# Altium footprint library WallLight.PcbLib: 33 footprints (part 1 of 3)
Each footprint in its own frame and in the unit in brackets; x right, y up, seen from the top. Pads: shape width x height; smd on the part's side, far side on the other; paste and mask are expansions set on the pad; w line width, h text height; cw(c..) or ccw(c..) is an arc to the next point about the centre after c.
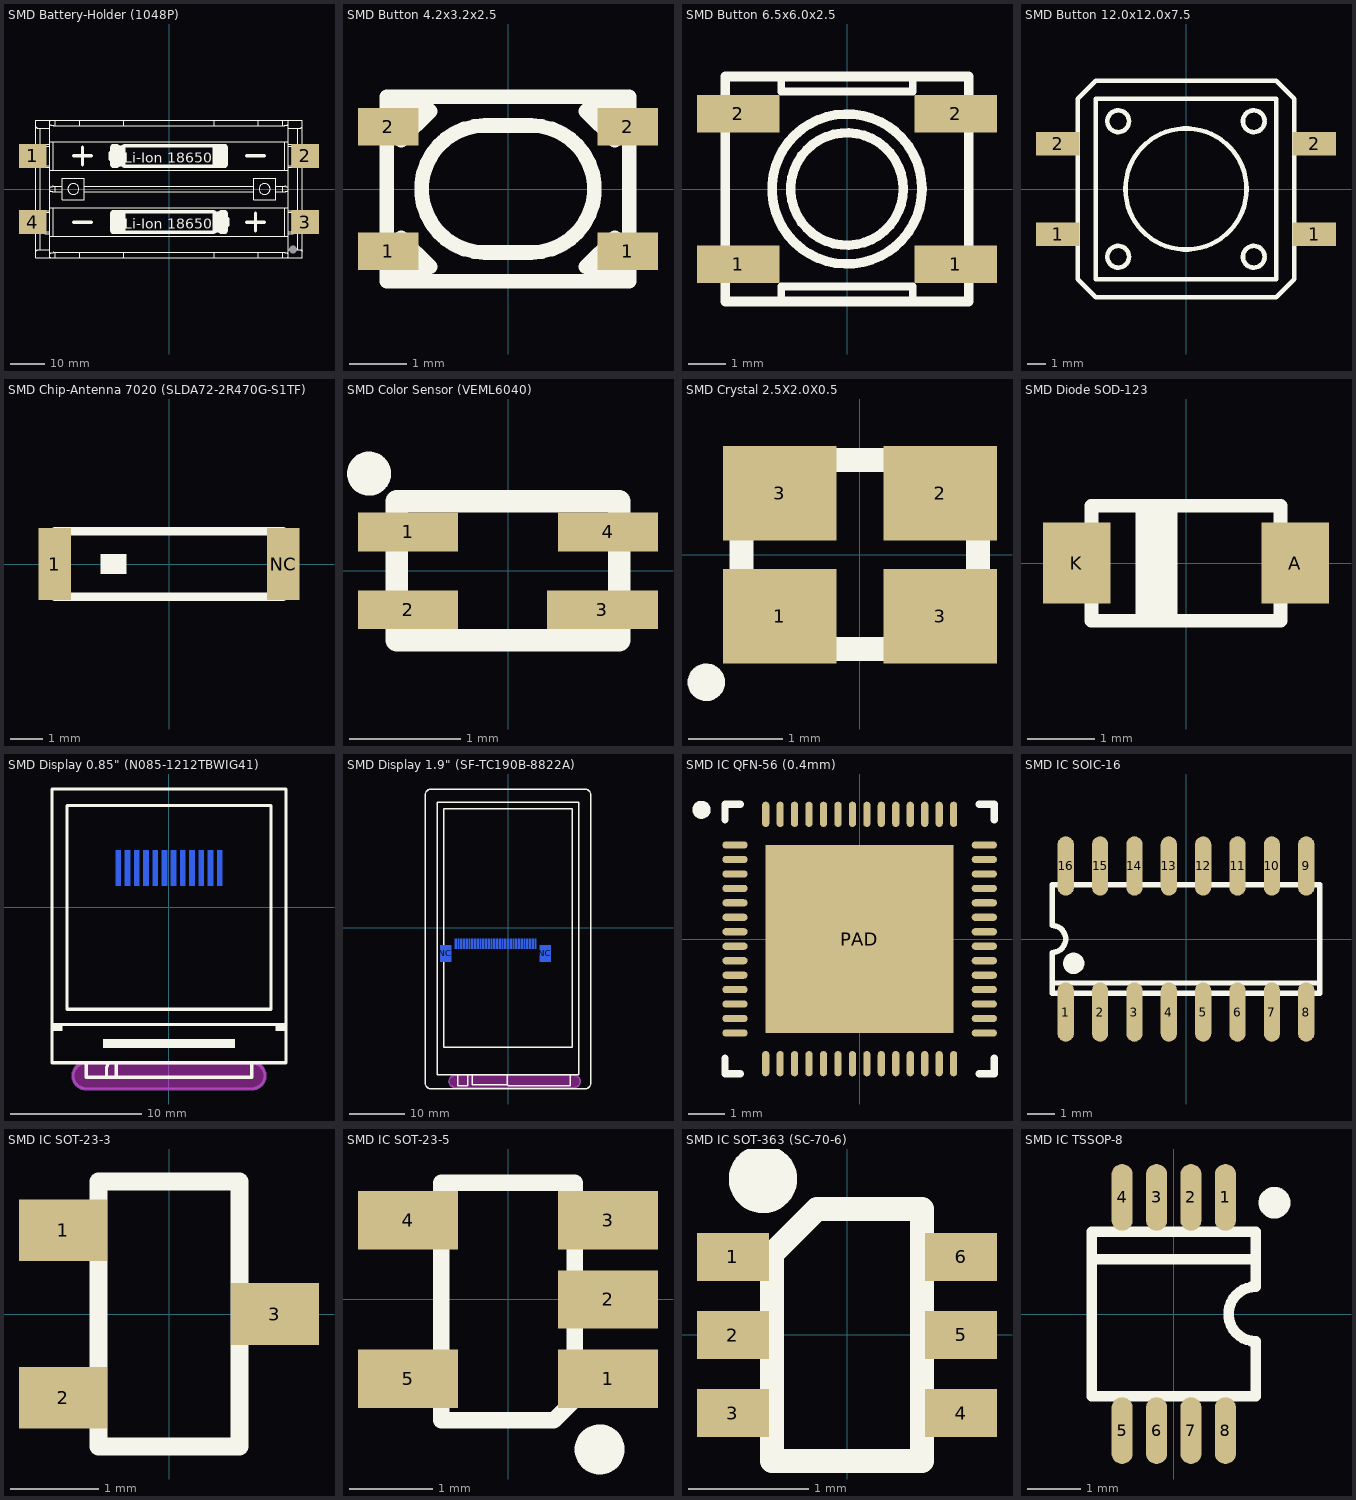
[diagram p0: the footprints below, top view; thin cyan lines are the x and y axes]

## SMD Battery-Holder (1048P) [mm]
pads (5):
  rect 8x7 smd: 1(-39.35,9.55) 2(39.35,9.55) 3(39.35,-9.55) 4(-39.35,-9.55)
  round 0 hole 2.4 unplated: NC(35.85,-17.5)
Top Overlay:
  drawing of 7051 lines, arcs and shapes, not listed
  text "Li-Ion 18650" at -13,-12.55 h5
  text "Li-Ion 18650" at -13,6.55 h5
3D body "INR18650-35E.step": height 18.65, standoff 0.35, extent -32.851,-18.7 32.851,-0.4
3D body "User Library-Blossom 1048.x_t": height 14.88, standoff -1.53, extent -43.002,-19.888 43.002,19.888
3D body "INR18650-35E.step": height 18.65, standoff 0.35, extent -32.851,0.4 32.851,18.7

## SMD Button 4.2x3.2x2.5 [mm]
height 3
pads (4):
  rect 1.05x0.65 smd: 1(-2.075,-1.075) 1(2.075,-1.075) 2(-2.075,1.075) 2(2.075,1.075)
Top Overlay:
  lines w0.254: -2.1,-1.2 ccw(c-1.7,-1.2) -1.7,-1.6 ; -2.1,1.2 cw(c-1.7,1.2) -1.7,1.6 ; -1.6,-1.4 ccw(c-1.95,-1.4) -1.95,-1.05 -1.95,-0.95 ; -1.6,1.4 cw(c-1.95,1.4) -1.95,1.05 -1.95,0.95 ; -1.45,-1.45 -1.675,-1.45 -1.95,-1.175 -1.95,-0.95 ; -1.35,-1.35 -1.85,-0.85 -1.95,-0.95 ; 1.35,-1.35 1.85,-0.85 1.95,-0.95 ; 1.45,-1.45 1.675,-1.45 1.95,-1.175 1.95,-0.95 ; 1.6,-1.4 cw(c1.95,-1.4) 1.95,-1.05 1.95,-0.95 ; 1.6,1.4 ccw(c1.95,1.4) 1.95,1.05 1.95,0.95 ; 2.1,-1.2 cw(c1.7,-1.2) 1.7,-1.6 ; 2.1,1.2 ccw(c1.7,1.2) 1.7,1.6 ; -1.95,0.95 -1.85,0.85 -1.35,1.35 -1.45,1.45 -1.675,1.45 -1.95,1.175 -1.95,0.95 ; -1.7,-1.6 -1.7,-1.6 ; -1.7,1.6 -1.7,1.6 ; 1.7,-1.6 1.7,-1.6 ; 1.7,1.6 1.7,1.6 ; 1.95,0.95 1.85,0.85 1.35,1.35 1.45,1.45 1.675,1.45 1.95,1.175 1.95,0.95 ; -2.1,-1.6 -2.1,0 -2.1,1.6 0,1.6 2.1,1.6 2.1,0 2.1,-1.6 0,-1.6 -2.1,-1.6 ; -0.4,-1.1 cw(c-0.4,0) -0.4,1.1 0,1.1 0.4,1.1 cw(c0.4,0) 0.4,-1.1 0,-1.1 -0.4,-1.1
3D body "SKRPAC.x_t": height 2.5, standoff 0, extent -2.3,-1.6 2.3,1.6

## SMD Button 6.5x6.0x2.5 [mm]
height 3
pads (4):
  rect 2.2x1 smd: 1(-2.9,-2) 1(2.9,-2) 2(-2.9,2) 2(2.9,2)
Top Overlay:
  circle w0.254: c0,0 r2
  circle w0.254: c0,0 r1.5
  lines w0.203: -1.75,-3 -1.75,-2.6 1.75,-2.6 1.75,-3 ; -1.75,3 -1.75,2.6 1.75,2.6 1.75,3
  lines w0.254: -3.25,-3 -3.25,3 3.25,3 3.25,-3 -3.25,-3
3D body "evqq2-dhmsw2-02w_.x_t": height 2.5, standoff 0, extent -3.3,-3 3.3,3

## SMD Button 12.0x12.0x7.5 [mm]
height 3
pads (4):
  rect 2.4x1.3 smd: 1(-7.1,-2.5) 1(7.1,-2.5) 2(-7.1,2.5) 2(7.1,2.5)
Top Overlay:
  circle w0.254: c-3.75,3.75 r0.6
  circle w0.254: c0,0 r3.35
  circle w0.254: c3.75,3.75 r0.6
  circle w0.254: c-3.75,-3.75 r0.6
  circle w0.254: c3.75,-3.75 r0.6
  lines w0.254: -6,-5 -5,-6 0,-6 5,-6 6,-5 6,0 6,5 5,6 0,6 -5,6 -6,5 -6,0 -6,-5 ; -5,-5 0,-5 5,-5 5,0 5,5 0,5 -5,5 -5,0 -5,-5
3D body "Tactal Switch - SMD (12mmx12mmx7.5mm).x_t": height 7.51, standoff 0.01, extent -7.684,-6.007 7.683,6.007

## SMD Chip-Antenna 7020 (SLDA72-2R470G-S1TF) [mm]
pads (2):
  rect 1x2.2 smd: 1(-3.5,0) NC(3.5,0)
Top Overlay:
  rectangle: -2.1,-0.3 -1.3,0.3
  lines w0.254: -3.5,-1 -3.5,1 3.5,1 3.5,-1 -3.5,-1
3D body "SLDA72-2R470G-S1TF.x_t": height 1, standoff 0, extent -3.5,-1 3.5,1

## SMD Color Sensor (VEML6040) [mm]
pads (4):
  rect 0.9x0.35 smd: 1(-0.9,0.35) 2(-0.9,-0.35) 4(0.9,0.35)
  rect 1x0.35 smd: 3(0.85,-0.35)
Top Overlay:
  circle w0.2: c-1.25,0.875 r0.098
  lines w0.203: -1,-0.625 0,-0.625 1,-0.625 1,0 1,0.625 0,0.625 -1,0.625 -1,0 -1,-0.625
3D body "84593 VEML6040.x_t": height 1, standoff 0, extent -1,-0.625 1,0.625

## SMD Crystal 2.5X2.0X0.5 [mm] "SMD_LED_RED"
height 8.65
pads (4):
  rect 1.2x1 smd: 1(-0.85,-0.65) 2(0.85,0.65) 3(-0.85,0.65) 3(0.85,-0.65)
Top Overlay:
  circle w0.2: c-1.625,-1.35 r0.098
  lines w0.254: -1.25,-1 1.25,-1 1.25,1 -1.25,1 -1.25,-1
3D body "2520 SMD Crystal Oscillator.x_b": height 0.7, standoff 0, extent -1.25,-1 1.25,1

## SMD Diode SOD-123 [mm] "SM LED; 2 Flat Leads"
height 1.3
pads (2):
  rect 1x1.2 smd: A(1.62,0) K(-1.62,0)
Top Overlay:
  region: -0.125,0.875 -0.75,0.875 -0.75,-0.9 -0.125,-0.9
  lines w0.2: -1.4,-0.85 1.4,-0.85 ; -1.4,0.85 1.4,0.85
  lines w0.203: -1.4,-0.85 -1.4,0.85 ; 1.4,-0.85 1.4,0.85
3D body "User Library-SOD-123_DiodesInc.step": height 1.42, standoff -0.03, extent -1.925,-0.85 1.925,0.85

## SMD Display 0.85" (N085-1212TBWIG41) [mm]
pads (12):
  rect 0.4x2.7 smd far side: 1(3.85,2.98) 2(3.15,2.98) 3(2.45,2.98) 4(1.75,2.98) 5(1.05,2.98) 6(0.35,2.98) 7(-0.35,2.98) 8(-1.05,2.98) 9(-1.75,2.98) 10(-2.45,2.98) 11(-3.15,2.98) 12(-3.85,2.98)
Top Overlay:
  rectangle: -5,-10.7 5,-10
  region: 8.9,-8.9 8.1,-8.9 8.1,-9.4 8.9,-9.4
  rectangle: -8.9,-9.4 -8.1,-8.9
  lines w0.254: -8.9,-8.9 8.9,-8.9 ; -6.302,-11.8 -6.302,-12.9 6.302,-12.9 6.302,-11.8 ; -4.752,-12.852 -4.752,-12.179 -4.6,-11.8 ; -4,-12.9 -4,-11.9 ; -8.9,-11.8 -8.9,9 8.9,9 8.9,-11.8 -8.9,-11.8 ; -7.75,-7.75 -7.75,7.75 7.75,7.75 7.75,-7.75 -7.75,-7.75
Bottom Overlay:
  drawing of 265 lines, arcs and shapes, not listed
  text "12" at -4.25,-1.65 h0.81
  text "1" at 3.75,-1.65 h0.81
Keep-Out Layer:
  board cut-out: -6.307,-11.8 -6.406,-11.796 -6.601,-11.828 -6.786,-11.899 -6.952,-12.008 -7.092,-12.148 -7.201,-12.314 -7.272,-12.499 -7.305,-12.694 -7.3,-12.794 -7.305,-12.894 -7.273,-13.092 -7.2,-13.28 -7.091,-13.448 -6.948,-13.59 -6.78,-13.7 -6.592,-13.773 -6.394,-13.805 -6.294,-13.8 6.294,-13.8 6.394,-13.805 6.593,-13.774 6.781,-13.702 6.95,-13.592 7.093,-13.45 7.202,-13.281 7.274,-13.093 7.305,-12.894 7.3,-12.794 7.305,-12.694 7.273,-12.499 7.201,-12.314 7.093,-12.147 6.953,-12.007 6.787,-11.899 6.601,-11.827 6.406,-11.795 6.307,-11.8
Mechanical 1:
  lines w0.254: -6.3,-13.8 cw(c-6.3,-12.8) -6.3,-11.8 6.3,-11.8 cw(c6.3,-12.8) 6.3,-13.8 -6.3,-13.8
3D body "N085-1212TBWIG41.x_t": height 1.5, standoff -1.7, extent -8.874,-12.875 8.874,9.025

## SMD Display 1.9" (SF-TC190B-8822A) [mm]
pads (32):
  rect 0.32x1.8 smd far side: 1(5.015,-2.85) 2(4.515,-2.85) 3(4.015,-2.85) 4(3.515,-2.85) 5(3.015,-2.85) 6(2.515,-2.85) 7(2.015,-2.85) 8(1.515,-2.85) 9(1.015,-2.85) 10(0.515,-2.85) 11(0.015,-2.85) 12(-0.485,-2.85) 13(-0.985,-2.85) 14(-1.485,-2.85) 15(-1.985,-2.85) 16(-2.485,-2.85) 17(-2.985,-2.85) 18(-3.485,-2.85) 19(-3.985,-2.85) 20(-4.485,-2.85) 21(-4.985,-2.85) 22(-5.485,-2.85) 23(-5.985,-2.85) 24(-6.485,-2.85) 25(-6.985,-2.85) 26(-7.485,-2.85) 27(-7.985,-2.85) 28(-8.485,-2.85) 29(-8.985,-2.85) 30(-9.485,-2.85)
  rect 2x3 smd far side: NC(-11.27,-4.6) NC(6.8,-4.6)
Top Overlay:
  lines w0.254: -12.813,-26.7 -12.813,22.798 -12.811,22.8 0,22.8 12.811,22.8 12.813,22.798 12.813,-26.7 ; -12.811,-26.698 0,-26.698 12.811,-26.698 ; -9.1,-26.7 -9.1,-28.7 -7.3,-28.7 -7.3,-26.7 ; -6.5,-26.698 -6.5,-28.5 -0.1,-28.5 ; -0.1,-26.698 -0.1,-28.5 ; 11.3,-26.7 11.3,-28.7 0.1,-28.7 -0.1,-28.5 ; -15,-28.275 ccw(c-14.025,-28.275) -14.025,-29.25 0,-29.25 14.025,-29.25 ccw(c14.025,-28.275) 15,-28.275 15,24.268 ccw(c14.018,24.268) 14.018,25.25 0,25.25 -14.018,25.25 ccw(c-14.018,24.268) -15,24.268 -15,-28.275 ; -11.65,-21.65 -11.65,0 -11.65,21.65 0,21.65 11.65,21.65 11.65,0 11.65,-21.65 0,-21.65 -11.65,-21.65
Bottom Overlay:
  circle w0.4: c3.25,-22 r0.15
  lines w0.254: -12.47,-7.8 -12.47,-8.5 -11.97,-8.5 -12.17,-8.5 ; -11.77,-6.15 -11.77,-3.25 7.3,-3.25 7.3,-6.15 ; -11.47,-8.5 -11.07,-8.5 ; -10.57,-8.5 -10.17,-8.5 ; -10.435,-3.25 -10.435,-5.3 -10.235,-5.5 -10.235,-7.2 ; -10.235,-6.15 -12.47,-6.15 -12.47,-6.799 ccw(c-12.069,-6.799) -12.069,-7.2 7.599,-7.2 ccw(c7.599,-6.799) 8,-6.799 8,-6.15 5.765,-6.15 ; -9.985,-7.25 -9.985,-26.915 ccw(c-9.4,-26.915) -9.4,-27.5 -9.1,-27.5 ; -9.67,-8.5 -9.27,-8.5 ; -8.77,-8.5 -8.37,-8.5 ; -8.7,-21 -8.7,-17.9 -8.5,-17.9 -8.5,-20.9 ; -8.5,-23.5 -8.5,-25.7 -8,-25.7 -8,-23.5 ; -7.9,-21 -7.9,-17.9 -7.7,-17.9 -7.7,-20.9 ; -7.87,-8.5 -7.47,-8.5 ; -7.5,-23.5 -7.5,-25.7 -7,-25.7 -7,-23.5 ; -7.1,-21 -7.1,-17.9 -6.9,-17.9 -6.9,-20.9 ; -6.97,-8.5 -6.57,-8.5 ; -6.3,-21 -6.3,-17.9 -6.1,-17.9 -6.1,-20.9 ; -6.07,-8.5 -5.67,-8.5 ; -5.5,-21 -5.5,-17.9 -5.3,-17.9 -5.3,-20.9 ; -5.17,-8.5 -4.77,-8.5 ; -4.7,-21 -4.7,-17.9 -4.5,-17.9 -4.5,-20.9 ; -4.27,-8.5 -3.87,-8.5 ; -3.37,-8.5 -2.97,-8.5 ; -2.4,-8.5 -2,-8.5 ; -1.5,-8.5 -1.1,-8.5 ; -0.6,-8.5 -0.2,-8.5 ; 0.3,-8.5 0.7,-8.5 ; 1.2,-8.5 1.6,-8.5 ; 2.1,-8.5 2.5,-8.5 ; 3,-8.5 3.4,-8.5 ; 3.9,-8.5 4.3,-8.5 ; 4.8,-8.5 5.2,-8.5 ; 5.515,-7.25 5.515,-10.2 ; 5.7,-8.5 6.1,-8.5 ; 5.765,-7.2 5.765,-5.5 5.965,-5.3 5.965,-3.25 ; 6.6,-8.5 7,-8.5 ; 7.7,-8.5 7.5,-8.5 8,-8.5 8,-7.8 ; -9.1,-27.5 -9.1,-28.7 -7.3,-28.7 -7.3,-28 -7.1,-27.6 ; -9.1,-27.5 -9.1,-23.9 cw(c-8.7,-23.9) -8.7,-23.5 -6.8,-23.5 cw(c-6.8,-23.9) -6.4,-23.9 -6.4,-26.559 cw(c-6.741,-26.559) -6.5,-26.8 -6.9,-27.2 -7.1,-27.6 ; -7.1,-27.6 -6.9,-27.6 cw(c-6.9,-28) -6.5,-28 -6.5,-28.5 -0.1,-28.5 ; -0.1,-28.5 0.1,-28.7 11.3,-28.7 11.3,-10.8 ccw(c10.7,-10.8) 10.7,-10.2 5.515,-10.2 ; -0.1,-28.5 -0.1,-14.2 ccw(c-0.6,-14.2) -0.6,-13.7 -3.3,-13.7 ccw(c-3.3,-14.2) -3.8,-14.2 -3.8,-20.5 cw(c-4.3,-20.5) -4.3,-21 -8.5,-21 -8.9,-21 cw(c-8.9,-20.5) -9.4,-20.5 -9.4,-10.7 cw(c-8.9,-10.7) -8.9,-10.2 5.515,-10.2 ; 1.05,-15.1 1.55,-15.1 1.55,-14.15 1.05,-14.15 1.05,-15.1 ; 2.1,-15.1 2.6,-15.1 2.6,-14.15 2.1,-14.15 2.1,-15.1 ; 2.5,-22.75 2.5,-16.75 8.5,-16.75 8.5,-22.75 2.5,-22.75 ; 3.15,-15.1 3.65,-15.1 3.65,-14.15 3.15,-14.15 3.15,-15.1 ; 4.2,-15.1 4.7,-15.1 4.7,-14.15 4.2,-14.15 4.2,-15.1 ; 7.7,-15.1 8.2,-15.1 8.2,-14.15 7.7,-14.15 7.7,-15.1 ; 8.75,-15.1 9.25,-15.1 9.25,-14.15 8.75,-14.15 8.75,-15.1 ; 9.8,-15.1 10.3,-15.1 10.3,-14.15 9.8,-14.15 9.8,-15.1
Keep-Out Layer:
  board cut-out: -9.601,-26.751 -9.713,-26.746 -9.935,-26.782 -10.144,-26.863 -10.332,-26.986 -10.49,-27.145 -10.613,-27.332 -10.694,-27.542 -10.73,-27.763 -10.725,-27.875 -10.73,-27.987 -10.695,-28.209 -10.614,-28.418 -10.491,-28.606 -10.332,-28.765 -10.144,-28.887 -9.935,-28.968 -9.713,-29.004 -9.601,-28.999 12.001,-28.999 12.113,-29.005 12.336,-28.97 12.546,-28.89 12.734,-28.767 12.893,-28.608 13.016,-28.419 13.096,-28.209 13.131,-27.987 13.125,-27.875 13.13,-27.763 13.094,-27.541 13.013,-27.332 12.891,-27.144 12.732,-26.985 12.544,-26.863 12.335,-26.782 12.113,-26.746 12.001,-26.751
Mechanical 1:
  lines w0.254: -9.6,-29 cw(c-9.6,-27.875) -9.6,-26.75 12,-26.75 cw(c12,-27.875) 12,-29 -9.6,-29
3D body "SF-TC190B-8822A.x_t": height 2.9, standoff -3.6, extent -15,-29.24 15,25.259

## SMD IC QFN-56 (0.4mm) [mm] "QFN, 48-Leads, Body 7x7mm, Pitch 0.5mm, IPC Medium Density"
height 0.9
pads (57):
  oval 0.7x0.2 smd: 1(-3.45,2.6) 2(-3.45,2.2) 3(-3.45,1.8) 4(-3.45,1.4) 5(-3.45,1) 6(-3.45,0.6) 7(-3.45,0.2) 8(-3.45,-0.2) 9(-3.45,-0.6) 10(-3.45,-1) 11(-3.45,-1.4) 12(-3.45,-1.8) 13(-3.45,-2.2) 14(-3.45,-2.6) 29(3.45,-2.6) 30(3.45,-2.2) 31(3.45,-1.8) 32(3.45,-1.4) 33(3.45,-1) 34(3.45,-0.6) 35(3.45,-0.2) 36(3.45,0.2) 37(3.45,0.6) 38(3.45,1) 39(3.45,1.4) 40(3.45,1.8) 41(3.45,2.2) 42(3.45,2.6)
  oval 0.2x0.7 smd: 15(-2.6,-3.45) 16(-2.2,-3.45) 17(-1.8,-3.45) 18(-1.4,-3.45) 19(-1,-3.45) 20(-0.6,-3.45) 21(-0.2,-3.45) 22(0.2,-3.45) 23(0.6,-3.45) 24(1,-3.45) 25(1.4,-3.45) 26(1.8,-3.45) 27(2.2,-3.45) 28(2.6,-3.45) 43(2.6,3.45) 44(2.2,3.45) 45(1.8,3.45) 46(1.4,3.45) 47(1,3.45) 48(0.6,3.45) 49(0.2,3.45) 50(-0.2,3.45) 51(-0.6,3.45) 52(-1,3.45) 53(-1.4,3.45) 54(-1.8,3.45) 55(-2.2,3.45) 56(-2.6,3.45)
  rect 5.2x5.2 smd: PAD(0,0)
Top Overlay:
  circle w0.25: c-4.375,3.575 r0.125
  lines w0.2: -3.725,-3.3 -3.725,-3.725 -3.3,-3.725 ; -3.725,3.3 -3.725,3.725 -3.3,3.725 ; 3.3,-3.725 3.725,-3.725 3.725,-3.3 ; 3.3,3.725 3.725,3.725 3.725,3.3
3D body "User Library-QFN56_0_4.x_t": height 0.8, standoff 0, extent -3.5,-3.5 3.5,3.5

## SMD IC SOIC-16 [mm]
height 2
pads (16):
  oval 0.6x2.2 smd: 1(-4.445,-2.7) 2(-3.175,-2.7) 3(-1.905,-2.7) 4(-0.635,-2.7) 5(0.635,-2.7) 6(1.905,-2.7) 7(3.175,-2.7) 8(4.445,-2.7) 9(4.445,2.7) 10(3.175,2.7) 11(1.905,2.7) 12(0.635,2.7) 13(-0.635,2.7) 14(-1.905,2.7) 15(-3.175,2.7) 16(-4.445,2.7)
Top Overlay:
  circle w0.406: c-4.15,-0.9 r0.191
  lines w0.2: -4.95,-2 4.95,-2 4.95,2 -4.95,2 ; -4.95,-1.625 4.95,-1.625
  lines w0.203: -4.95,-2 -4.95,-0.5 ccw(c-4.95,0) -4.95,0.5 -4.95,2
3D body "User Library-SOIC-16-1.step": height 1.4, standoff 0, extent -4.95,-3 4.95,3

## SMD IC SOT-23-3 [mm]
pads (3):
  rect 1x0.7 smd: 1(-1.2,0.95) 2(-1.2,-0.95) 3(1.2,0)
Top Overlay:
  lines w0.203: -0.8,-1.5 0.8,-1.5 0.8,1.5 -0.8,1.5 -0.8,-1.5
3D body "CircuitWorks-SOT-23.step": height 1.1, standoff 0, extent -1.301,-1.5 1.199,1.5

## SMD IC SOT-23-5 [mm] "SOT-223/SC-73; 4 Leads; Body 6.7 x 7.3 mm, inc. leads (LxW max)"
height 1.8
pads (5):
  rect 1.2x0.7 smd: 1(1.2,-0.95) 2(1.2,0) 3(1.2,0.95) 4(-1.2,0.95) 5(-1.2,-0.95)
Top Overlay:
  circle w0.4: c1.1,-1.8 r0.1
  lines w0.2: -0.8,-1.45 -0.8,1.4 0.8,1.4 0.8,-1.2 0.55,-1.45 -0.8,-1.45
3D body "CircuitWorks-SOT-23-5.step": height 1.1, standoff 0, extent -1.301,-1.5 1.199,1.5

## SMD IC SOT-363 (SC-70-6) [mm]
pads (6):
  rect 0.6x0.4 smd: 1(-0.95,0.65) 2(-0.95,0) 3(-0.95,-0.65) 4(0.95,-0.65) 5(0.95,0) 6(0.95,0.65)
Top Overlay:
  circle w0.37: c-0.7,1.3 r0.1
  lines w0.203: -0.625,-1.05 0.625,-1.05 0.625,1.05 -0.25,1.05 -0.625,0.675 -0.625,-1.05
3D body "User Library-SC70-6.step": height 0.92, standoff -0.03, extent -1.05,-1 1.05,1

## SMD IC TSSOP-8 [mm] "Shrink Small Outline; 16 Leads; Body Width 4.4 mm; Pitch 0.65 mm"
height 1.1
pads (8):
  oval 0.4x1.26 smd: 1(0.975,2.2) 2(0.325,2.2) 3(-0.325,2.2) 4(-0.975,2.2) 5(-0.975,-2.2) 6(-0.325,-2.2) 7(0.325,-2.2) 8(0.975,-2.2)
Top Overlay:
  circle w0.35: c1.9,2.1 r0.125
  lines w0.2: -1.55,1.033 1.55,1.033 ; -1.55,-1.55 1.55,-1.55 1.55,-0.517 cw(c1.55,0) 1.55,0.517 1.55,1.55 -1.55,1.55 -1.55,-1.55
3D body "User Library-TSSOP-8 3_1x3_1.X_T": height 1.07, standoff -0.03, extent -1.55,-2.5 1.55,2.5